# Altium footprint library Footprints.PcbLib: 67 footprints (part 4 of 5)
Each footprint in its own frame and in the unit in brackets; x right, y up, seen from the top. Pads: shape width x height; smd on the part's side, far side on the other; paste and mask are expansions set on the pad; w line width, h text height; cw(c..) or ccw(c..) is an arc to the next point about the centre after c.
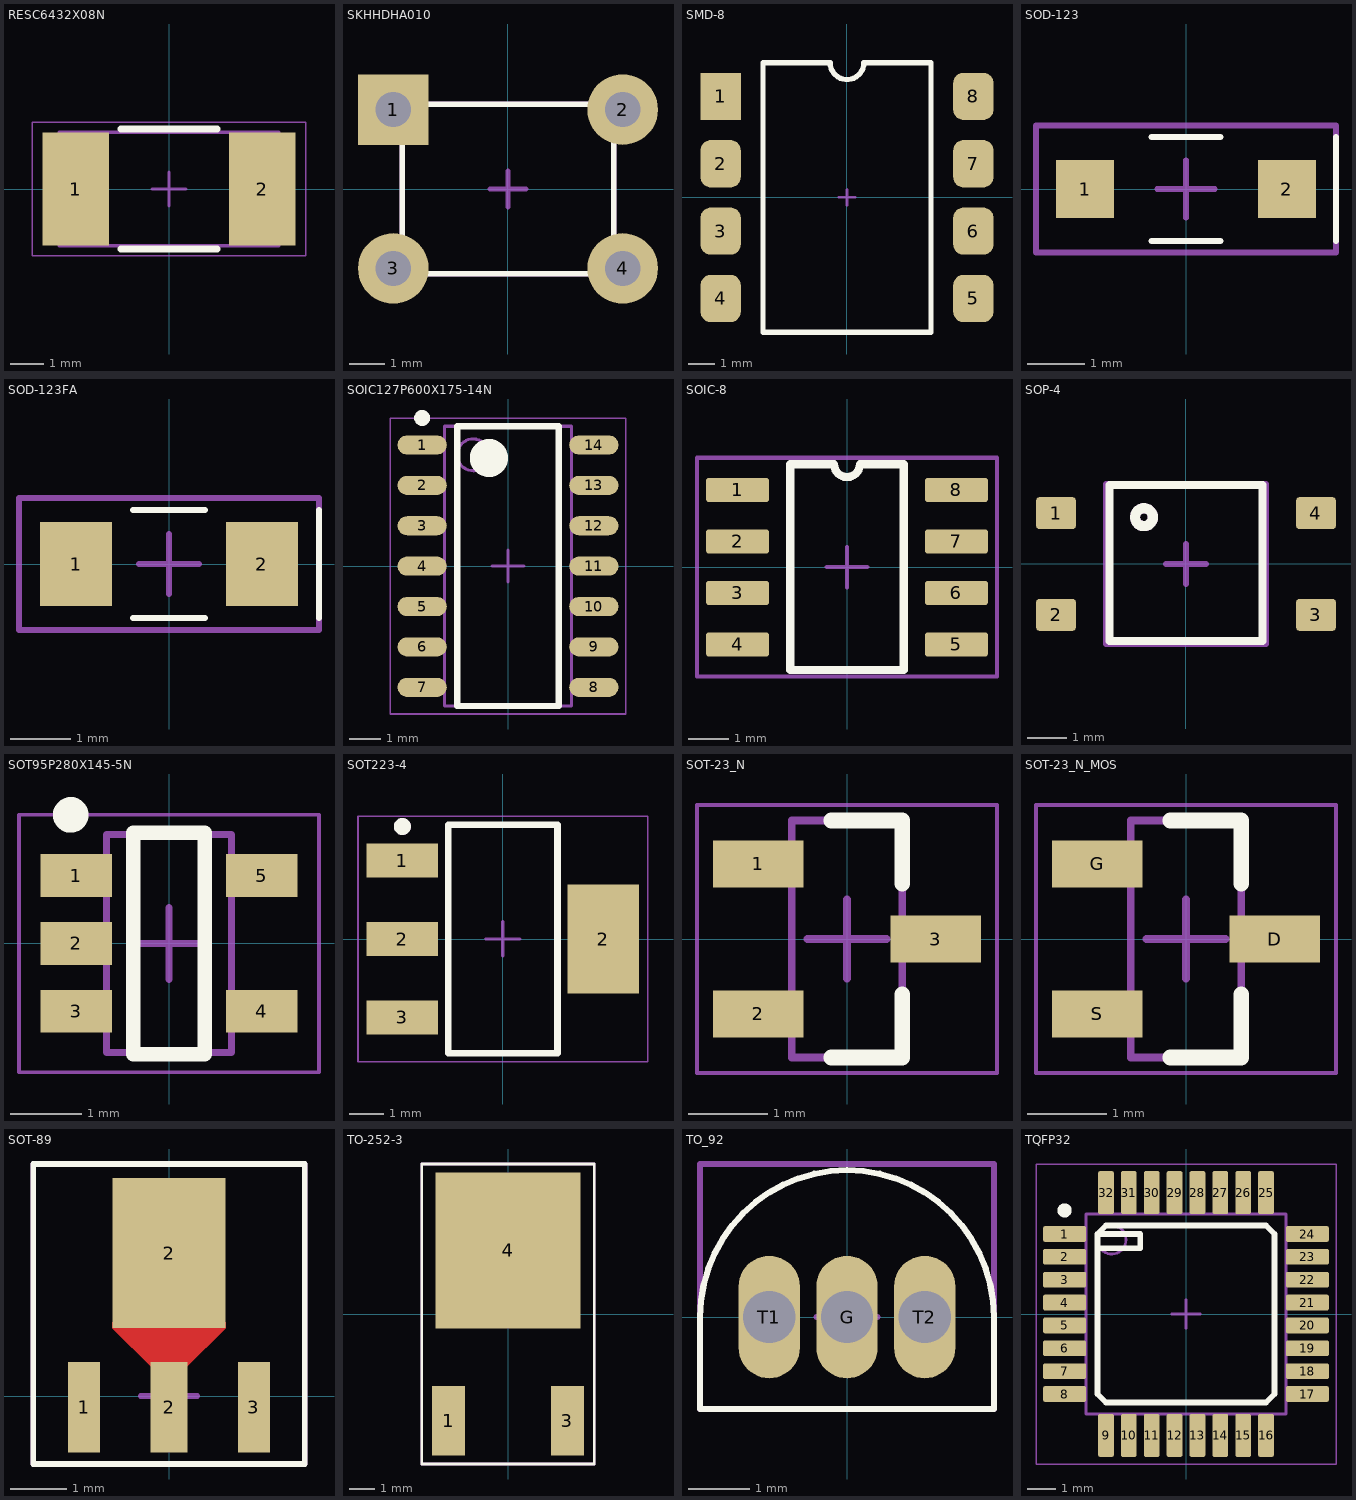
[diagram p3: the footprints below, top view; thin cyan lines are the x and y axes]

## RESC6432X08N [mm] "Chip Resistor, 2-Leads, Body 6.40x3.20mm, IPC Medium Density"
height 0.8
pads (2):
  rect 2x3.4 smd: 1(-2.8,0) 2(2.8,0)
Top Overlay:
  lines w0.2: -1.45,-1.8 1.45,-1.8 ; -1.45,1.8 1.45,1.8
Polarity (Mech13):
  lines w0.1: -3.3,-1.7 3.3,-1.7 3.3,1.7 -3.3,1.7 -3.3,-1.7
Mechanical 15:
  lines w0.05: -4.1,-2 4.1,-2 4.1,2 -4.1,2 -4.1,-2
  lines w0.1: -0.5,0 0.5,0 ; 0,-0.5 0,0.5
3D body "CircuitWorks-RESISTOR 2512.step": height 0.62, standoff 0.01, extent -3.175,-1.63 3.175,1.63

## SKHHDHA010 [mm]
pads (4):
  rect 2x2 hole 1: 1(-3.25,2.25)
  round 2 hole 1: 2(3.25,2.25) 3(-3.25,-2.25) 4(3.25,-2.25)
Top Overlay:
  lines w0.15: -3,-2.4 3,-2.4 3,2.4 -3,2.4 -3,-2.4
Mechanical 15:
  lines w0.15: -0.5,0 0.5,0 ; 0,-0.5 0,0.5 ; -3,-2.4 3,-2.4 3,2.4 -3,2.4 -3,-2.4
3D body "skhhdja010.stp": height 17.01, standoff -3.49, extent -3.95,-3.1 3.95,3.1

## SMD-8 [mm]
pads (8):
  rect 1.52x1.78 smd: 1(-4.765,3.81)
  rrect50% 1.52x1.78 smd: 2(-4.765,1.27) 3(-4.765,-1.27) 4(-4.765,-3.81) 5(4.765,-3.81) 6(4.765,-1.27) 7(4.765,1.27) 8(4.765,3.81)
Top Overlay:
  lines w0.2: -3.17,-5.08 -3.17,5.08 -0.635,5.08 ccw(c0,5.08) 0.635,5.08 3.17,5.08 3.17,-5.08 -3.17,-5.08
Mechanical 15:
  lines w0.1: -0.3,0 0.3,0 ; 0,-0.3 0,0.3
3D body "DIP8-OP7.STEP": height 4.38, standoff 0.01, extent -5.08,-4.885 5.08,4.885

## SOD-123 [mm]
pads (2):
  rect 1x1 smd: 1(-1.75,0) 2(1.75,0)
Top Overlay:
  lines w0.1: -0.6,-0.9 0.6,-0.9 ; -0.6,0.9 0.6,0.9 ; 2.6,-0.9 2.6,0.9
Polarity (Mech13):
  lines w0.1: 2.6,-0.9 2.6,0.9
Mechanical 15:
  lines w0.1: -0.5,0 0.5,0 ; 0,-0.5 0,0.5 ; -2.6,-1.1 -2.6,1.1 2.6,1.1 2.6,-1.1 -2.6,-1.1
3D body "CircuitWorks-SOD123.step": height 1.28, standoff 0.01, extent -1.85,-0.8 1.85,0.8

## SOD-123FA [mm]
pads (2):
  rect 1.2x1.4 smd: 1(-1.55,0) 2(1.55,0)
Top Overlay:
  lines w0.1: -0.6,-0.9 0.6,-0.9 ; -0.6,0.9 0.6,0.9 ; 2.5,-0.9 2.5,0.9
Polarity (Mech13):
  lines w0.1: 2.5,-0.9 2.5,0.9
Mechanical 15:
  lines w0.1: -0.5,0 0.5,0 ; 0,-0.5 0,0.5 ; -2.5,-1.1 -2.5,1.1 2.5,1.1 2.5,-1.1 -2.5,-1.1
3D body "CircuitWorks-SOD123.step": height 1.28, standoff 0.01, extent -1.85,-0.8 1.85,0.8

## SOIC127P600X175-14N [mm] "SOIC, 14-Leads, Body 8.65x3.90mm, Pitch 1.27mm, IPC Medium Density"
height 1.75
pads (14):
  oval 1.55x0.6 smd: 1(-2.7,3.81) 2(-2.7,2.54) 3(-2.7,1.27) 4(-2.7,0) 5(-2.7,-1.27) 6(-2.7,-2.54) 7(-2.7,-3.81) 8(2.7,-3.81) 9(2.7,-2.54) 10(2.7,-1.27) 11(2.7,0) 12(2.7,1.27) 13(2.7,2.54) 14(2.7,3.81)
Top Overlay:
  circle w0.6: c-0.6,3.4 r0.3
  circle w0.25: c-2.7,4.66 r0.125
  lines w0.2: -1.6,-4.4 1.6,-4.4 1.6,4.4 -1.6,4.4 -1.6,-4.4
Polarity (Mech13):
  circle w0.1: c-1.1,3.5 r0.5
  lines w0.1: -2,-4.4 2,-4.4 2,4.4 -2,4.4 -2,-4.4
Mechanical 15:
  lines w0.05: -3.7,-4.65 3.7,-4.65 3.7,4.65 -3.7,4.65 -3.7,-4.65
  lines w0.1: -0.5,0 0.5,0 ; 0,-0.5 0,0.5
3D body "User Library-SOIC-14.step": height 1.76, standoff 0.01, extent -3,-4.375 3,4.375

## SOIC-8 [mm]
pads (8):
  rrect22% 1.55x0.6 smd: 1(-2.7,1.905) 2(-2.7,0.635) 3(-2.7,-0.635) 4(-2.7,-1.905) 5(2.7,-1.905) 6(2.7,-0.635) 7(2.7,0.635) 8(2.7,1.905)
Top Overlay:
  lines w0.2: -1.4,-2.54 1.4,-2.54 1.4,2.54 0.318,2.54 cw(c0,2.54) -0.318,2.54 -1.4,2.54 -1.4,-2.54
Mechanical 15:
  lines w0.1: -0.5,0 0.5,0 ; 0,-0.5 0,0.5 ; -3.7,-2.7 3.7,-2.7 3.7,2.7 -3.7,2.7 -3.7,-2.7
3D body "THVD1429DT--3DModel-STEP-56544.STEP": height 1.75, standoff 0, extent -2.997,-2.451 2.997,2.451

## SOP-4 [mm]
pads (4):
  rrect22% 1x0.8 smd: 1(-3.25,1.27) 2(-3.25,-1.27) 3(3.25,-1.27) 4(3.25,1.27)
Top Overlay:
  circle w0.254: c-1.05,1.17 r0.224
  lines w0.2: -1.915,-1.93 -1.915,1.97 1.915,1.97 1.915,-1.93 -1.915,-1.93
Polarity (Mech13):
  circle w0.254: c-1.05,1.17 r0.224
Mechanical 15:
  lines w0.15: -0.5,0 0.5,0 ; 0,-0.5 0,0.5 ; -2,-2 2,-2 2,2 -2,2 -2,-2
3D body "User Library-4-SOP.STEP": height 2.11, standoff 0.01, extent -3.4,-2.15 3.4,2.15

## SOT95P280X145-5N [mm] "SOT23, 5-Leads, Body 2.90x2.80mm, Pitch 0.95mm, IPC Medium Density"
height 1.45
pads (5):
  rect 1x0.6 smd: 1(-1.3,0.95) 2(-1.3,0) 3(-1.3,-0.95) 4(1.3,-0.95) 5(1.3,0.95)
Top Overlay:
  circle w0.25: c-1.375,1.8 r0.125
  lines w0.2: -0.5,-1.55 -0.5,1.55 0.5,1.55 0.5,-1.55 -0.5,-1.55
Polarity (Mech13):
  lines w0.1: -0.875,-1.525 0.875,-1.525 0.875,1.525 -0.875,1.525 -0.875,-1.525
Mechanical 15:
  lines w0.05: -2.1,-1.8 2.1,-1.8 2.1,1.8 -2.1,1.8 -2.1,-1.8
  lines w0.1: -0.5,0 0.5,0 ; 0,-0.5 0,0.5
3D body "CircuitWorks-SOT-23-5.step": height 1.11, standoff 0.01, extent -1.25,-1.5 1.25,1.5

## SOT223-4 [mm] "SOT223, 4-Leads, Body 6,50x7,00mm (avg), Pitch 2,30mm, IPC Medium Density"
height 1.8
pads (4):
  rect 2.1x1 smd: 1(-2.95,2.3) 2(-2.95,0) 3(-2.95,-2.3)
  rect 2.1x3.2 smd: 2(2.95,0)
Top Overlay:
  circle w0.25: c-2.95,3.3 r0.125
  lines w0.2: -1.6,-3.35 1.6,-3.35 1.6,3.35 -1.6,3.35 -1.6,-3.35
Polarity (Mech13):
  circle w0.25: c-2.95,3.3 r0.125
Mechanical 15:
  lines w0.05: -4.25,-3.6 4.25,-3.6 4.25,3.6 -4.25,3.6 -4.25,-3.6
  lines w0.1: -0.5,0 0.5,0 ; 0,-0.5 0,0.5
3D body "CircuitWorks-SOT-223.step": height 1.69, standoff 0.01, extent -3.53,-3.25 3.43,3.25

## SOT-23_N [mm] "SOT23, 3-Leads, Body 2.9x1.3mm, Pitch 0.95mm, Lead Span 2.3mm, IPC Medium Density"
height 1.11
pads (3):
  rect 1.15x0.6 smd: 1(-1.125,0.95) 2(-1.125,-0.95) 3(1.125,0)
Top Overlay:
  lines w0.2: -0.2,-1.5 0.7,-1.5 0.7,-0.7 ; -0.2,1.5 0.7,1.5 0.7,0.7
Mechanical 1:
  lines w0.1: -0.7,-1.5 -0.7,1.5 0.7,1.5 0.7,-1.5 -0.7,-1.5
Mechanical 15:
  lines w0.05: -1.9,-1.7 1.9,-1.7 1.9,1.7 -1.9,1.7 -1.9,-1.7
  lines w0.1: -0.5,0 0.5,0 ; 0,-0.5 0,0.5
3D body "CircuitWorks-SOT-23.step": height 1.11, standoff 0.01, extent -1.25,-1.5 1.25,1.5

## SOT-23_N_MOS [mm] "SOT23, 3-Leads, Body 2.9x1.3mm, Pitch 0.95mm, Lead Span 2.3mm, IPC Medium Density"
height 1.11
pads (3):
  rect 1.15x0.6 smd: D(1.125,0) G(-1.125,0.95) S(-1.125,-0.95)
Top Overlay:
  lines w0.2: -0.2,-1.5 0.7,-1.5 0.7,-0.7 ; -0.2,1.5 0.7,1.5 0.7,0.7
Mechanical 1:
  lines w0.1: -0.7,-1.5 0.7,-1.5 0.7,1.5 -0.7,1.5 -0.7,-1.5
Mechanical 15:
  lines w0.05: -1.9,-1.7 -1.9,1.7 1.9,1.7 1.9,-1.7 -1.9,-1.7
  lines w0.1: -0.5,0 0.5,0 ; 0,-0.5 0,0.5
3D body "CircuitWorks-SOT-23.step": height 1.11, standoff 0.01, extent -1.25,-1.5 1.25,1.5

## SOT-89 [mm]
pads (4):
  rect 0.57x1.6 smd: 1(-1.5,-0.2) 3(1.5,-0.2)
  rect 0.65x1.6 smd: 2(0,-0.2)
  rect 2x2.65 smd: 2(0,2.525)
Top Layer:
  region: -1,1.2 -0.3,0.5 0.3,0.5 1,1.2 1,1.3 -1,1.3
Top Overlay:
  lines w0.1: -2.4,-1.2 -2.4,4.1 2.4,4.1 2.4,-1.2 -2.4,-1.2
Top Solder:
  region: -1.1,1.2 -1.1,1.1 -0.4,0.4 0.4,0.4 1.1,1.1 1.1,1.2
Mechanical 15:
  lines w0.1: -0.5,0 0.5,0 ; 0,-0.5 0,0.5 ; -2.4,-1.2 -2.4,4.1 2.4,4.1 2.4,-1.2 -2.4,-1.2
3D body "User Library-SOT89-3.STEP": height 1.55, standoff 0.01, extent -2.25,-0.65 2.25,3.6

## TO-252-3 [mm]
pads (3):
  rect 1.3x2.75 smd: 1(-2.34,-4.2) 3(2.34,-4.2)
  rect 5.7x6.15 smd: 4(0,2.5)
Top Overlay:
  lines w0.1: -3.4,-5.9 3.4,-5.9 3.4,5.9 -3.4,5.9 -3.4,-5.9
Mechanical 15:
  lines w0.1: -0.5,0 0.5,0 ; 0,-0.5 0,0.5 ; -3.4,-5.9 3.4,-5.9 3.4,5.9 -3.4,5.9 -3.4,-5.9
3D body "User Library-TO-252-3.step": height 2.42, standoff 0.01, extent -3.35,-5.102 3.35,5.25

## TO_92 [mm]
pads (3):
  oval 1x2 hole 0.85: G(0,0) T1(-1.27,0) T2(1.27,0)
Top Overlay:
  lines w0.1: -2.4,-1.5 -2.4,0 cw(c0,0) 2.4,0 2.4,-1.5 -2.4,-1.5
Mechanical 15:
  lines w0.1: -0.5,0 0.5,0 ; 0,-0.5 0,0.5 ; -2.4,-1.5 -2.4,2.5 2.4,2.5 2.4,-1.5 -2.4,-1.5
3D body "ALSRobot-TO-92A.step": height 5.21, standoff -5.79, extent -2.4,-1.53 2.4,2.4

## TQFP32 [mm] "CQFP, 32-Leads, Body 9,00x9,00mm, Pitch 0,80mm, IPC Medium Density"
height 1.2
pads (32):
  rrect22% 1.5x0.55 smd: 1(-4.25,2.8) 2(-4.25,2) 3(-4.25,1.2) 4(-4.25,0.4) 5(-4.25,-0.4) 6(-4.25,-1.2) 7(-4.25,-2) 8(-4.25,-2.8) 17(4.25,-2.8) 18(4.25,-2) 19(4.25,-1.2) 20(4.25,-0.4) 21(4.25,0.4) 22(4.25,1.2) 23(4.25,2) 24(4.25,2.8)
  rrect22% 0.55x1.5 smd: 9(-2.8,-4.25) 10(-2,-4.25) 11(-1.2,-4.25) 12(-0.4,-4.25) 13(0.4,-4.25) 14(1.2,-4.25) 15(2,-4.25) 16(2.8,-4.25) 25(2.8,4.25) 26(2,4.25) 27(1.2,4.25) 28(0.4,4.25) 29(-0.4,4.25) 30(-1.2,4.25) 31(-2,4.25) 32(-2.8,4.25)
Top Overlay:
  circle w0.25: c-4.25,3.625 r0.125
  lines w0.2: -3.1,2.3 -1.6,2.3 -1.6,2.8 -3.1,2.8 ; -3.1,2.8 -3.1,-2.8 -2.8,-3.1 2.8,-3.1 3.1,-2.8 3.1,2.8 2.8,3.1 -2.8,3.1 -3.1,2.8
Polarity (Mech13):
  circle w0.1: c-2.6,2.6 r0.5
  lines w0.1: -3.5,-3.5 -3.5,3.5 3.5,3.5 3.5,-3.5 -3.5,-3.5
Mechanical 15:
  lines w0.05: -5.25,-5.25 -5.25,5.25 5.25,5.25 5.25,-5.25 -5.25,-5.25
  lines w0.1: -0.5,0 0.5,0 ; 0,-0.5 0,0.5
3D body "User Library-SW3dPS-atmega8 (tqfp32)_V2008.step": height 1.12, standoff 0.01, extent -4.8,-4.8 4.8,4.8